# Altium schematic symbol library con-amp.SCHLIB: 238 symbols (part 2 of 3) (continued)
## FTOP-12 (continued)
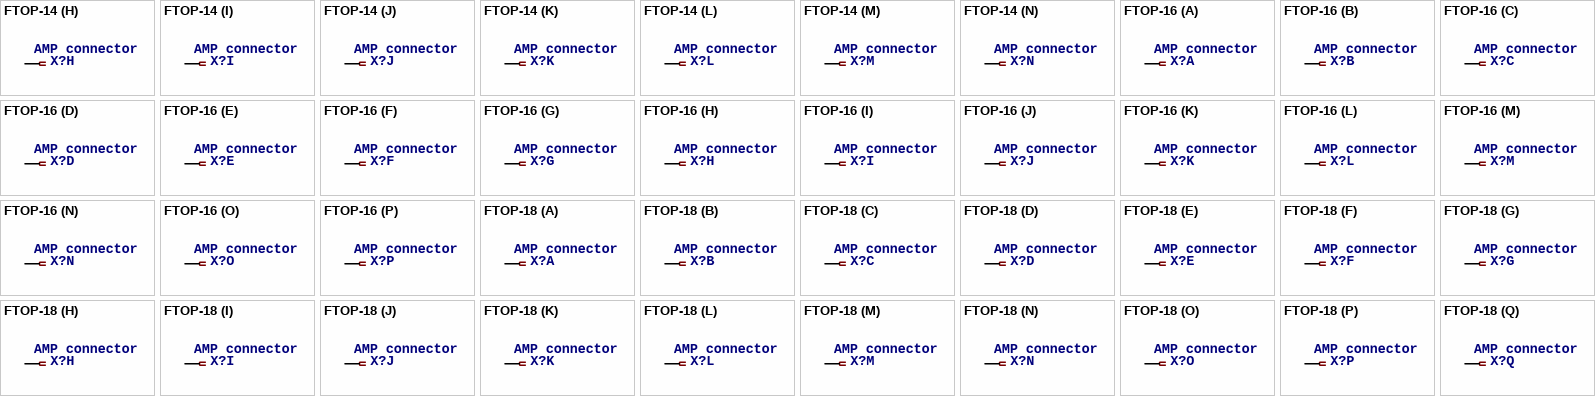
[diagram p16: symbols FTOP-14 to FTOP-18]

## FTOP-14
designator X?, comment AMP connector
footprint FTOP-14
part A pins: 1
part B pins: 2 1
part C pins: 3 1
part D pins: 4 1
part E pins: 5 1
part F pins: 6 1
part G pins: 7 1
part H pins: 8 1
part I pins: 9 1
part J pins: 10 1
part K pins: 11 1
part L pins: 12 1
part M pins: 13 1
part N pins: 14 1

## FTOP-16
designator X?, comment AMP connector
footprint FTOP-16
part A pins: 1
part B pins: 2 1
part C pins: 3 1
part D pins: 4 1
part E pins: 5 1
part F pins: 6 1
part G pins: 7 1
part H pins: 8 1
part I pins: 9 1
part J pins: 10 1
part K pins: 11 1
part L pins: 12 1
part M pins: 13 1
part N pins: 14 1
part O pins: 15 1
part P pins: 16 1

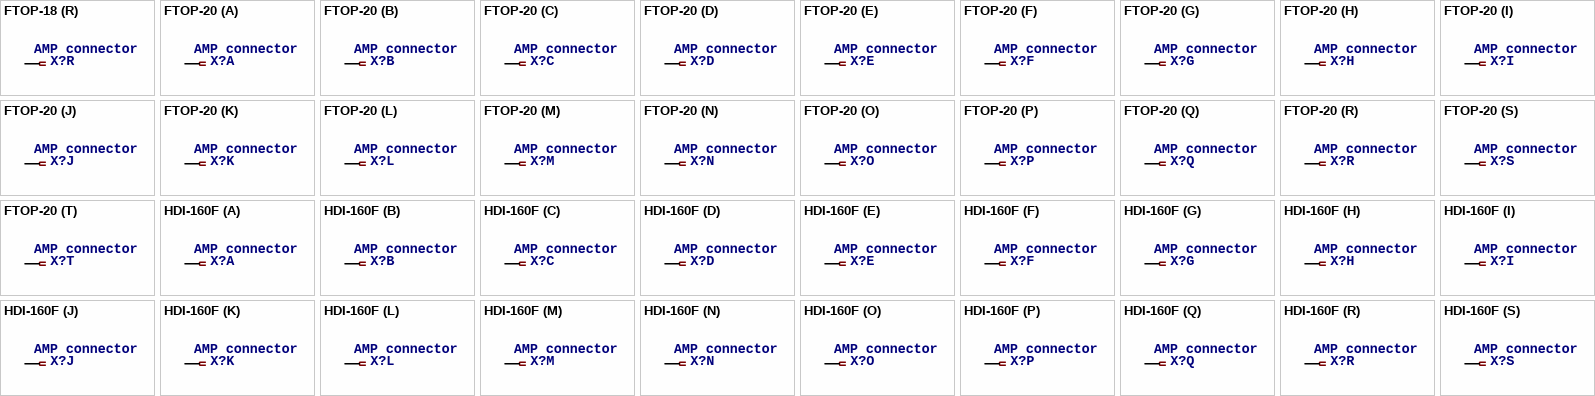
[diagram p17: symbols FTOP-18 to HDI-160F]

## FTOP-18
designator X?, comment AMP connector
footprint FTOP-18
part A pins: 1
part B pins: 2 1
part C pins: 3 1
part D pins: 4 1
part E pins: 5 1
part F pins: 6 1
part G pins: 7 1
part H pins: 8 1
part I pins: 9 1
part J pins: 10 1
part K pins: 11 1
part L pins: 12 1
part M pins: 13 1
part N pins: 14 1
part O pins: 15 1
part P pins: 16 1
part Q pins: 17 1
part R pins: 18 1

## FTOP-20
designator X?, comment AMP connector
footprint FTOP-20
part A pins: 1
part B pins: 2 1
part C pins: 3 1
part D pins: 4 1
part E pins: 5 1
part F pins: 6 1
part G pins: 7 1
part H pins: 8 1
part I pins: 9 1
part J pins: 10 1
part K pins: 11 1
part L pins: 12 1
part M pins: 13 1
part N pins: 14 1
part O pins: 15 1
part P pins: 16 1
part Q pins: 17 1
part R pins: 18 1
part S pins: 19 1
part T pins: 20 1

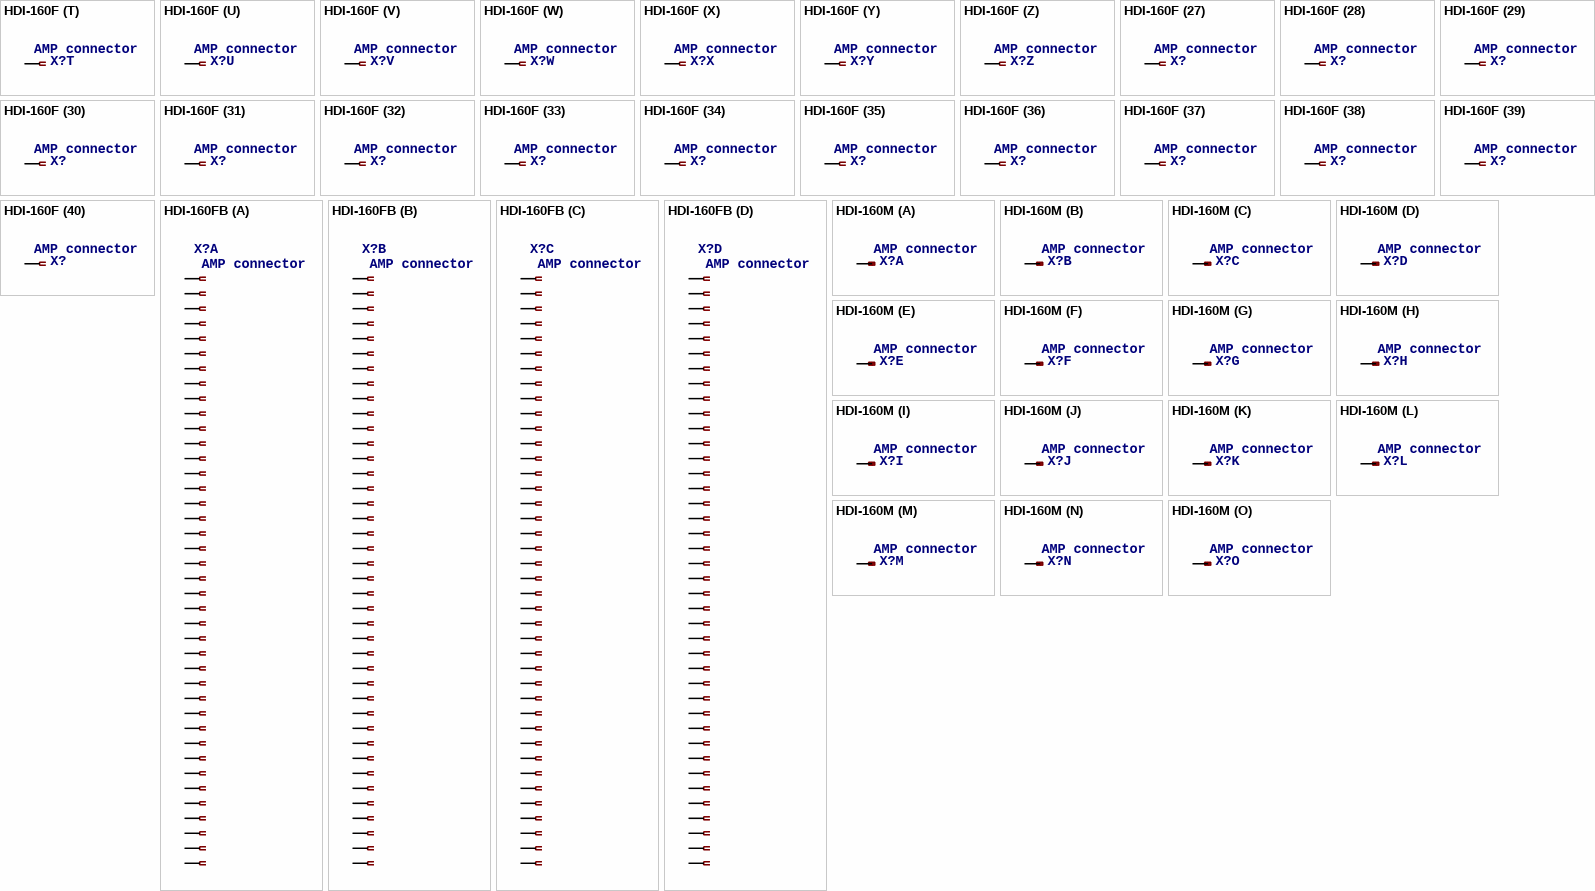
[diagram p18: symbols HDI-160F to HDI-160M]

## HDI-160F
designator X?, comment AMP connector
footprint HDI-160F
part A pins: A1 1
part B pins: A2 1
part C pins: A3 1
part D pins: A4 1
part E pins: A5 1
part F pins: A6 1
part G pins: A7 1
part H pins: A8 1
part I pins: A9 1
part J pins: A10 1
part K pins: A11 1
part L pins: A12 1
part M pins: A13 1
part N pins: A14 1
part O pins: A15 1
part P pins: A16 1
part Q pins: A17 1
part R pins: A18 1
part S pins: A19 1
part T pins: A20 1
part U pins: A21 1
part V pins: A22 1
part W pins: A23 1
part X pins: A24 1
part Y pins: A25 1
part Z pins: A26 1
part 27 pins: A27 1
part 28 pins: A28 1
part 29 pins: A29 1
part 30 pins: A30 1
part 31 pins: A31 1
part 32 pins: A32 1
part 33 pins: A33 1
part 34 pins: A34 1
part 35 pins: A35 1
part 36 pins: A36 1
part 37 pins: A37 1
part 38 pins: A38 1
part 39 pins: A39 1
part 40 pins: A40 1
part 41 pins: B1 1
part 42 pins: B2 1
part 43 pins: B3 1
part 44 pins: B4 1
part 45 pins: B5 1
part 46 pins: B6 1
part 47 pins: B7 1
part 48 pins: B8 1
part 49 pins: B9 1
part 50 pins: B10 1
part 51 pins: B11 1
part 52 pins: B12 1
part 53 pins: B13 1
part 54 pins: B14 1
part 55 pins: B15 1
part 56 pins: B16 1
part 57 pins: B17 1
part 58 pins: B18 1
part 59 pins: B19 1
part 60 pins: B20 1
part 61 pins: B21 1
part 62 pins: B22 1
part 63 pins: B23 1
part 64 pins: B24 1
part 65 pins: B25 1
part 66 pins: B26 1
part 67 pins: B27 1
part 68 pins: B28 1
part 69 pins: B29 1
part 70 pins: B30 1
part 71 pins: B31 1
part 72 pins: B32 1
part 73 pins: B33 1
part 74 pins: B34 1
part 75 pins: B35 1
part 76 pins: B36 1
part 77 pins: B37 1
part 78 pins: B38 1
part 79 pins: B39 1
part 80 pins: B40 1
part 81 pins: C1 1
part 82 pins: C2 1
part 83 pins: C3 1
part 84 pins: C4 1
part 85 pins: C5 1
part 86 pins: C6 1
part 87 pins: C7 1
part 88 pins: C8 1
part 89 pins: C9 1
part 90 pins: C10 1
part 91 pins: C11 1
part 92 pins: C12 1
part 93 pins: C13 1
part 94 pins: C14 1
part 95 pins: C15 1
part 96 pins: C16 1
part 97 pins: C17 1
part 98 pins: C18 1
part 99 pins: C19 1
part 100 pins: C20 1
part 101 pins: C21 1
part 102 pins: C22 1
part 103 pins: C23 1
part 104 pins: C24 1
part 105 pins: C25 1
part 106 pins: C26 1
part 107 pins: C27 1
part 108 pins: C28 1
part 109 pins: C29 1
part 110 pins: C30 1
part 111 pins: C31 1
part 112 pins: C32 1
part 113 pins: C33 1
part 114 pins: C34 1
part 115 pins: C35 1
part 116 pins: C36 1
part 117 pins: C37 1
part 118 pins: C38 1
part 119 pins: C39 1
part 120 pins: C40 1
part 121 pins: D1 1
part 122 pins: D2 1
part 123 pins: D3 1
part 124 pins: D4 1
part 125 pins: D5 1
part 126 pins: D6 1
part 127 pins: D7 1
part 128 pins: D8 1
part 129 pins: D9 1
part 130 pins: D10 1
part 131 pins: D11 1
part 132 pins: D12 1
part 133 pins: D13 1
part 134 pins: D14 1
part 135 pins: D15 1
part 136 pins: D16 1
part 137 pins: D17 1
part 138 pins: D18 1
part 139 pins: D19 1
part 140 pins: D20 1
part 141 pins: D21 1
part 142 pins: D22 1
part 143 pins: D23 1
part 144 pins: D24 1
part 145 pins: D25 1
part 146 pins: D26 1
part 147 pins: D27 1
part 148 pins: D28 1
part 149 pins: D29 1
part 150 pins: D30 1
part 151 pins: D31 1
part 152 pins: D32 1
part 153 pins: D33 1
part 154 pins: D34 1
part 155 pins: D35 1
part 156 pins: D36 1
part 157 pins: D37 1
part 158 pins: D38 1
part 159 pins: D39 1
part 160 pins: D40 1

## HDI-160FB
designator X?, comment AMP connector
footprint HDI-160F
part A pins: A1 1, A2 2, A3 3, A4 4, A5 5, A6 6, A7 7, A8 8, A9 9, A10 10, A11 11, A12 12, A13 13, A14 14, A15 15, A16 16, A17 17, A18 18, A19 19, A20 20, A21 21, A22 22, A23 23, A24 24, A25 25, A26 26, A27 27, A28 28, A29 29, A30 30, A31 31, A32 32, A33 33, A34 34, A35 35, A36 36, A37 37, A38 38, A39 39, A40 40
part B pins: B1 1, B2 2, B3 3, B4 4, B5 5, B6 6, B7 7, B8 8, B9 9, B10 10, B11 11, B12 12, B13 13, B14 14, B15 15, B16 16, B17 17, B18 18, B19 19, B20 20, B21 21, B22 22, B23 23, B24 24, B25 25, B26 26, B27 27, B28 28, B29 29, B30 30, B31 31, B32 32, B33 33, B34 34, B35 35, B36 36, B37 37, B38 38, B39 39, B40 40
part C pins: C1 1, C2 2, C3 3, C4 4, C5 5, C6 6, C7 7, C8 8, C9 9, C10 10, C11 11, C12 12, C13 13, C14 14, C15 15, C16 16, C17 17, C18 18, C19 19, C20 20, C21 21, C22 22, C23 23, C24 24, C25 25, C26 26, C27 27, C28 28, C29 29, C30 30, C31 31, C32 32, C33 33, C34 34, C35 35, C36 36, C37 37, C38 38, C39 39, C40 40
part D pins: D1 1, D2 2, D3 3, D4 4, D5 5, D6 6, D7 7, D8 8, D9 9, D10 10, D11 11, D12 12, D13 13, D14 14, D15 15, D16 16, D17 17, D18 18, D19 19, D20 20, D21 21, D22 22, D23 23, D24 24, D25 25, D26 26, D27 27, D28 28, D29 29, D30 30, D31 31, D32 32, D33 33, D34 34, D35 35, D36 36, D37 37, D38 38, D39 39, D40 40

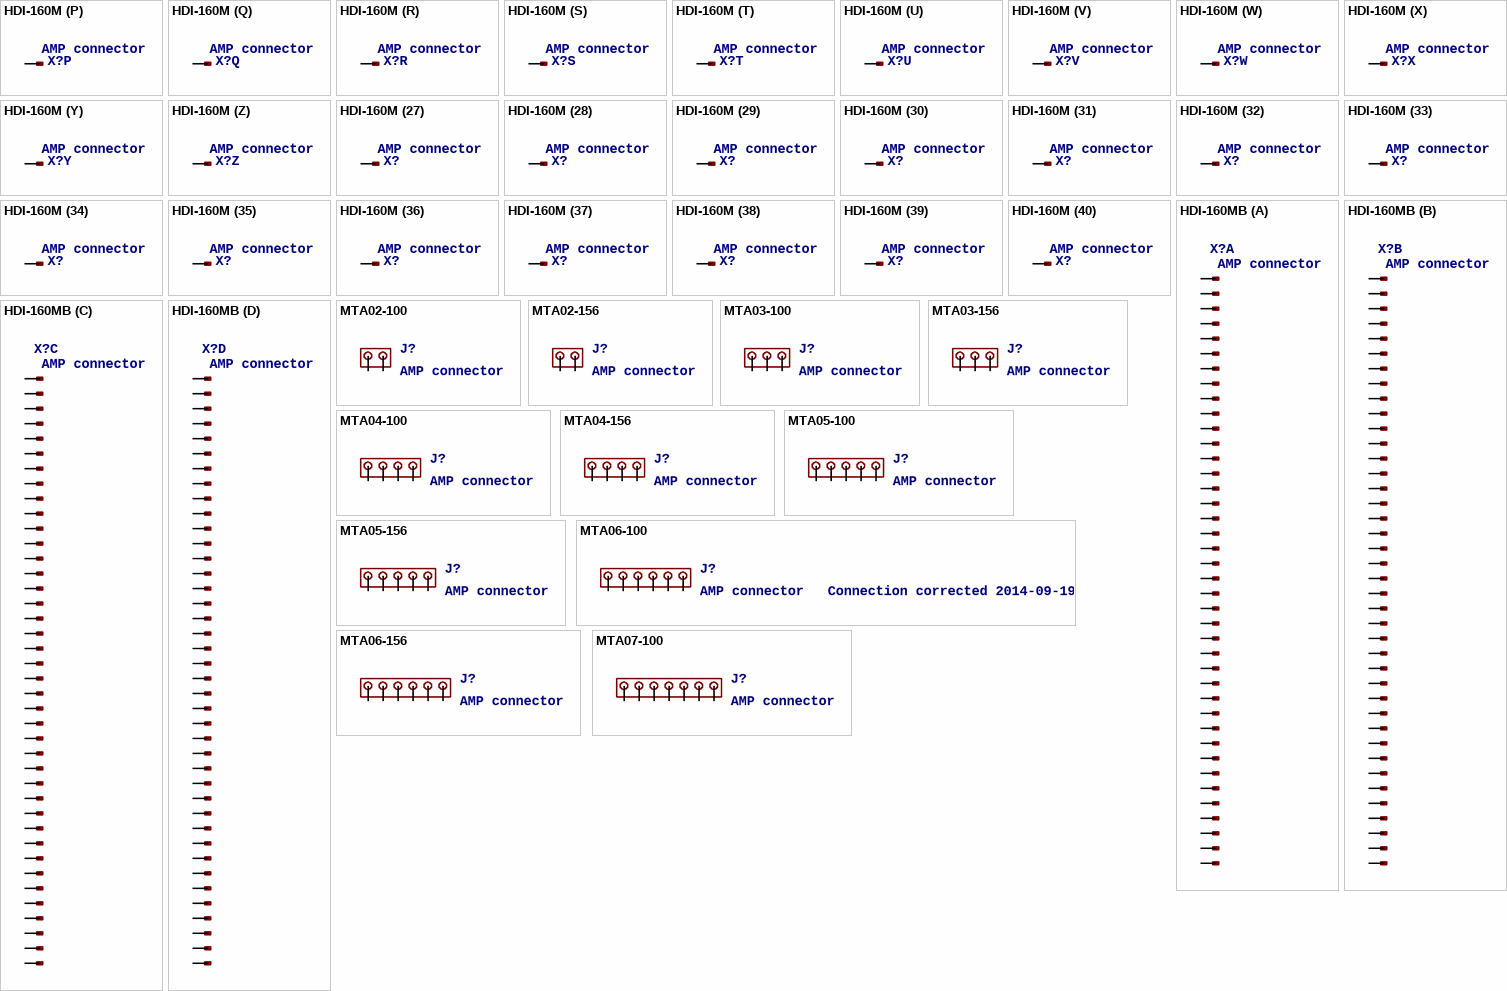
[diagram p19: symbols HDI-160M to MTA07-100]

## HDI-160M
designator X?, comment AMP connector
footprint HDI-160M
part A pins: A1 1
part B pins: A2 1
part C pins: A3 1
part D pins: A4 1
part E pins: A5 1
part F pins: A6 1
part G pins: A7 1
part H pins: A8 1
part I pins: A9 1
part J pins: A10 1
part K pins: A11 1
part L pins: A12 1
part M pins: A13 1
part N pins: A14 1
part O pins: A15 1
part P pins: A16 1
part Q pins: A17 1
part R pins: A18 1
part S pins: A19 1
part T pins: A20 1
part U pins: A21 1
part V pins: A22 1
part W pins: A23 1
part X pins: A24 1
part Y pins: A25 1
part Z pins: A26 1
part 27 pins: A27 1
part 28 pins: A28 1
part 29 pins: A29 1
part 30 pins: A30 1
part 31 pins: A31 1
part 32 pins: A32 1
part 33 pins: A33 1
part 34 pins: A34 1
part 35 pins: A35 1
part 36 pins: A36 1
part 37 pins: A37 1
part 38 pins: A38 1
part 39 pins: A39 1
part 40 pins: A40 1
part 41 pins: B1 1
part 42 pins: B2 1
part 43 pins: B3 1
part 44 pins: B4 1
part 45 pins: B5 1
part 46 pins: B6 1
part 47 pins: B7 1
part 48 pins: B8 1
part 49 pins: B9 1
part 50 pins: B10 1
part 51 pins: B11 1
part 52 pins: B12 1
part 53 pins: B13 1
part 54 pins: B14 1
part 55 pins: B15 1
part 56 pins: B16 1
part 57 pins: B17 1
part 58 pins: B18 1
part 59 pins: B19 1
part 60 pins: B20 1
part 61 pins: B21 1
part 62 pins: B22 1
part 63 pins: B23 1
part 64 pins: B24 1
part 65 pins: B25 1
part 66 pins: B26 1
part 67 pins: B27 1
part 68 pins: B28 1
part 69 pins: B29 1
part 70 pins: B30 1
part 71 pins: B31 1
part 72 pins: B32 1
part 73 pins: B33 1
part 74 pins: B34 1
part 75 pins: B35 1
part 76 pins: B36 1
part 77 pins: B37 1
part 78 pins: B38 1
part 79 pins: B39 1
part 80 pins: B40 1
part 81 pins: C1 1
part 82 pins: C2 1
part 83 pins: C3 1
part 84 pins: C4 1
part 85 pins: C5 1
part 86 pins: C6 1
part 87 pins: C7 1
part 88 pins: C8 1
part 89 pins: C9 1
part 90 pins: C10 1
part 91 pins: C11 1
part 92 pins: C12 1
part 93 pins: C13 1
part 94 pins: C14 1
part 95 pins: C15 1
part 96 pins: C16 1
part 97 pins: C17 1
part 98 pins: C18 1
part 99 pins: C19 1
part 100 pins: C20 1
part 101 pins: C21 1
part 102 pins: C22 1
part 103 pins: C23 1
part 104 pins: C24 1
part 105 pins: C25 1
part 106 pins: C26 1
part 107 pins: C27 1
part 108 pins: C28 1
part 109 pins: C29 1
part 110 pins: C30 1
part 111 pins: C31 1
part 112 pins: C32 1
part 113 pins: C33 1
part 114 pins: C34 1
part 115 pins: C35 1
part 116 pins: C36 1
part 117 pins: C37 1
part 118 pins: C38 1
part 119 pins: C39 1
part 120 pins: C40 1
part 121 pins: D1 1
part 122 pins: D2 1
part 123 pins: D3 1
part 124 pins: D4 1
part 125 pins: D5 1
part 126 pins: D6 1
part 127 pins: D7 1
part 128 pins: D8 1
part 129 pins: D9 1
part 130 pins: D10 1
part 131 pins: D11 1
part 132 pins: D12 1
part 133 pins: D13 1
part 134 pins: D14 1
part 135 pins: D15 1
part 136 pins: D16 1
part 137 pins: D17 1
part 138 pins: D18 1
part 139 pins: D19 1
part 140 pins: D20 1
part 141 pins: D21 1
part 142 pins: D22 1
part 143 pins: D23 1
part 144 pins: D24 1
part 145 pins: D25 1
part 146 pins: D26 1
part 147 pins: D27 1
part 148 pins: D28 1
part 149 pins: D29 1
part 150 pins: D30 1
part 151 pins: D31 1
part 152 pins: D32 1
part 153 pins: D33 1
part 154 pins: D34 1
part 155 pins: D35 1
part 156 pins: D36 1
part 157 pins: D37 1
part 158 pins: D38 1
part 159 pins: D39 1
part 160 pins: D40 1

## HDI-160MB
designator X?, comment AMP connector
footprint HDI-160M
part A pins: A1 1, A2 2, A3 3, A4 4, A5 5, A6 6, A7 7, A8 8, A9 9, A10 10, A11 11, A12 12, A13 13, A14 14, A15 15, A16 16, A17 17, A18 18, A19 19, A20 20, A21 21, A22 22, A23 23, A24 24, A25 25, A26 26, A27 27, A28 28, A29 29, A30 30, A31 31, A32 32, A33 33, A34 34, A35 35, A36 36, A37 37, A38 38, A39 39, A40 40
part B pins: B1 1, B2 2, B3 3, B4 4, B5 5, B6 6, B7 7, B8 8, B9 9, B10 10, B11 11, B12 12, B13 13, B14 14, B15 15, B16 16, B17 17, B18 18, B19 19, B20 20, B21 21, B22 22, B23 23, B24 24, B25 25, B26 26, B27 27, B28 28, B29 29, B30 30, B31 31, B32 32, B33 33, B34 34, B35 35, B36 36, B37 37, B38 38, B39 39, B40 40
part C pins: C1 1, C2 2, C3 3, C4 4, C5 5, C6 6, C7 7, C8 8, C9 9, C10 10, C11 11, C12 12, C13 13, C14 14, C15 15, C16 16, C17 17, C18 18, C19 19, C20 20, C21 21, C22 22, C23 23, C24 24, C25 25, C26 26, C27 27, C28 28, C29 29, C30 30, C31 31, C32 32, C33 33, C34 34, C35 35, C36 36, C37 37, C38 38, C39 39, C40 40
part D pins: D1 1, D2 2, D3 3, D4 4, D5 5, D6 6, D7 7, D8 8, D9 9, D10 10, D11 11, D12 12, D13 13, D14 14, D15 15, D16 16, D17 17, D18 18, D19 19, D20 20, D21 21, D22 22, D23 23, D24 24, D25 25, D26 26, D27 27, D28 28, D29 29, D30 30, D31 31, D32 32, D33 33, D34 34, D35 35, D36 36, D37 37, D38 38, D39 39, D40 40

## MTA02-100
designator J?, comment AMP connector
footprint 10X02MTA
pins: 1, 2

## MTA02-156
designator J?, comment AMP connector
footprint 1X2MTA
pins: 1, 2

## MTA03-100
designator J?, comment AMP connector
footprint 10X03MTA
pins: 1, 2, 3

## MTA03-156
designator J?, comment AMP connector
footprint 1X3MTA
pins: 1, 2, 3

## MTA04-100
designator J?, comment AMP connector
footprint 10X04MTA
pins: 1, 2, 3, 4

## MTA04-156
designator J?, comment AMP connector
footprint 1X4MTA
pins: 1, 2, 3, 4

## MTA05-100
designator J?, comment AMP connector
footprint 10X05MTA
pins: 1, 2, 3, 4, 5

## MTA05-156
designator J?, comment AMP connector
footprint 1X5MTA
pins: 1, 2, 3, 4, 5

## MTA06-100
designator J?, comment AMP connector   Connection corrected 2014-09-19
footprint 10X06MTA
pins: 1, 2, 3, 4, 5, 6

## MTA06-156
designator J?, comment AMP connector
footprint 1X6MTA
pins: 1, 2, 3, 4, 5, 6

## MTA07-100
designator J?, comment AMP connector
footprint 10X07MTA
pins: 1, 2, 3, 4, 5, 6, 7

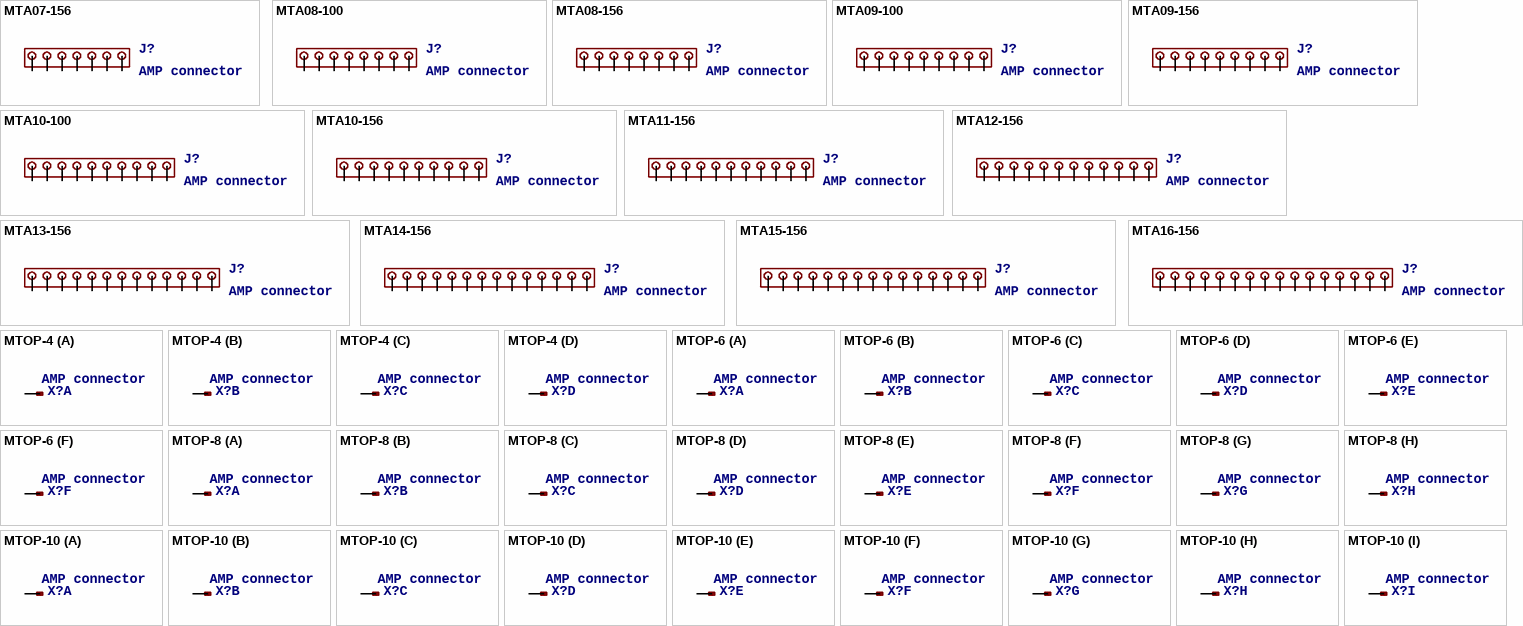
[diagram p20: symbols MTA07-156 to MTOP-10]

## MTA07-156
designator J?, comment AMP connector
footprint 1X7MTA
pins: 1, 2, 3, 4, 5, 6, 7

## MTA08-100
designator J?, comment AMP connector
footprint 10X08MTA
pins: 1, 2, 3, 4, 5, 6, 7, 8

## MTA08-156
designator J?, comment AMP connector
footprint 1X8MTA
pins: 1, 2, 3, 4, 5, 6, 7, 8

## MTA09-100
designator J?, comment AMP connector
footprint 10X09MTA
pins: 1, 2, 3, 4, 5, 6, 7, 8, 9

## MTA09-156
designator J?, comment AMP connector
footprint 1X9MTA
pins: 1, 2, 3, 4, 5, 6, 7, 8, 9

## MTA10-100
designator J?, comment AMP connector
footprint 10X10MTA
pins: 1, 2, 3, 4, 5, 6, 7, 8, 9, 10

## MTA10-156
designator J?, comment AMP connector
footprint 1X10MTA
pins: 1, 2, 3, 4, 5, 6, 7, 8, 9, 10

## MTA11-156
designator J?, comment AMP connector
footprint 1X11MTA
pins: 1, 2, 3, 4, 5, 6, 7, 8, 9, 10, 11

## MTA12-156
designator J?, comment AMP connector
footprint 1X12MTA
pins: 1, 2, 3, 4, 5, 6, 7, 8, 9, 10, 11, 12

## MTA13-156
designator J?, comment AMP connector
footprint 1X13MTA
pins: 1, 2, 3, 4, 5, 6, 7, 8, 9, 10, 11, 12, 13

## MTA14-156
designator J?, comment AMP connector
footprint 1X14MTA
pins: 1, 2, 3, 4, 5, 6, 7, 8, 9, 10, 11, 12, 13, 14

## MTA15-156
designator J?, comment AMP connector
footprint 1X15MTA
pins: 1, 2, 3, 4, 5, 6, 7, 8, 9, 10, 11, 12, 13, 14, 15

## MTA16-156
designator J?, comment AMP connector
footprint 1X16MTA
pins: 1, 2, 3, 4, 5, 6, 7, 8, 9, 10, 11, 12, 13, 14, 15, 16

## MTOP-4
designator X?, comment AMP connector
footprint MTOP-4
part A pins: 1
part B pins: 2 1
part C pins: 3 1
part D pins: 4 1

## MTOP-6
designator X?, comment AMP connector
footprint MTOP-6
part A pins: 1
part B pins: 2 1
part C pins: 3 1
part D pins: 4 1
part E pins: 5 1
part F pins: 6 1

## MTOP-8
designator X?, comment AMP connector
footprint MTOP-8
part A pins: 1
part B pins: 2 1
part C pins: 3 1
part D pins: 4 1
part E pins: 5 1
part F pins: 6 1
part G pins: 7 1
part H pins: 8 1

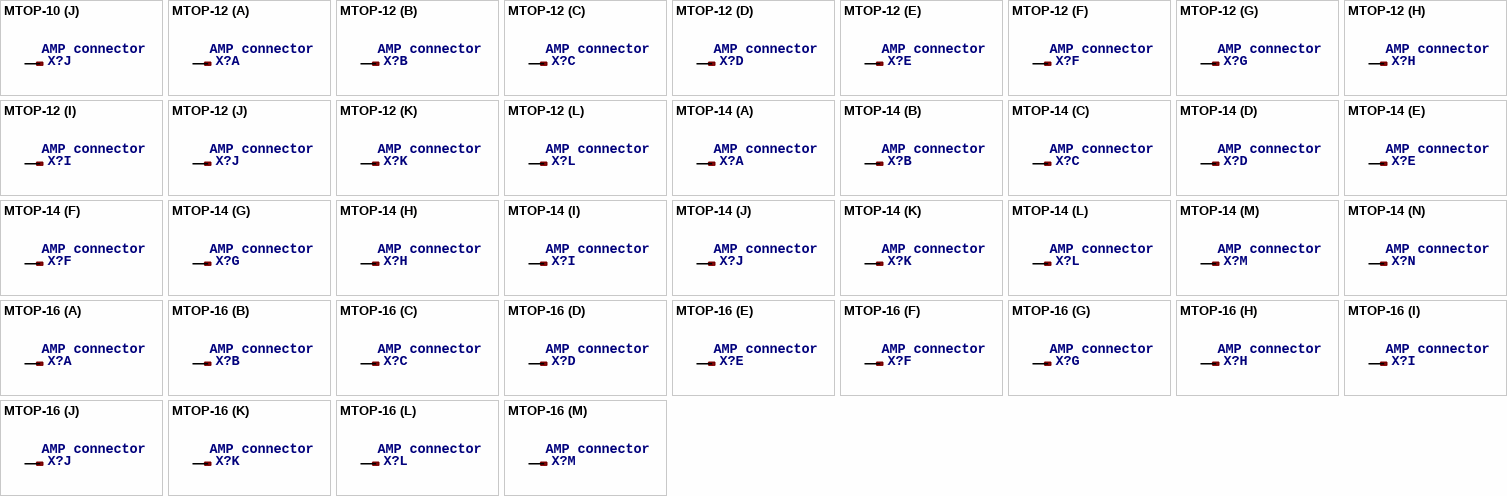
[diagram p21: symbols MTOP-10 to MTOP-16]

## MTOP-10
designator X?, comment AMP connector
footprint MTOP-10
part A pins: 1
part B pins: 2 1
part C pins: 3 1
part D pins: 4 1
part E pins: 5 1
part F pins: 6 1
part G pins: 7 1
part H pins: 8 1
part I pins: 9 1
part J pins: 10 1

## MTOP-12
designator X?, comment AMP connector
footprint MTOP-12
part A pins: 1
part B pins: 2 1
part C pins: 3 1
part D pins: 4 1
part E pins: 5 1
part F pins: 6 1
part G pins: 7 1
part H pins: 8 1
part I pins: 9 1
part J pins: 10 1
part K pins: 11 1
part L pins: 12 1

## MTOP-14
designator X?, comment AMP connector
footprint MTOP-14
part A pins: 1
part B pins: 2 1
part C pins: 3 1
part D pins: 4 1
part E pins: 5 1
part F pins: 6 1
part G pins: 7 1
part H pins: 8 1
part I pins: 9 1
part J pins: 10 1
part K pins: 11 1
part L pins: 12 1
part M pins: 13 1
part N pins: 14 1

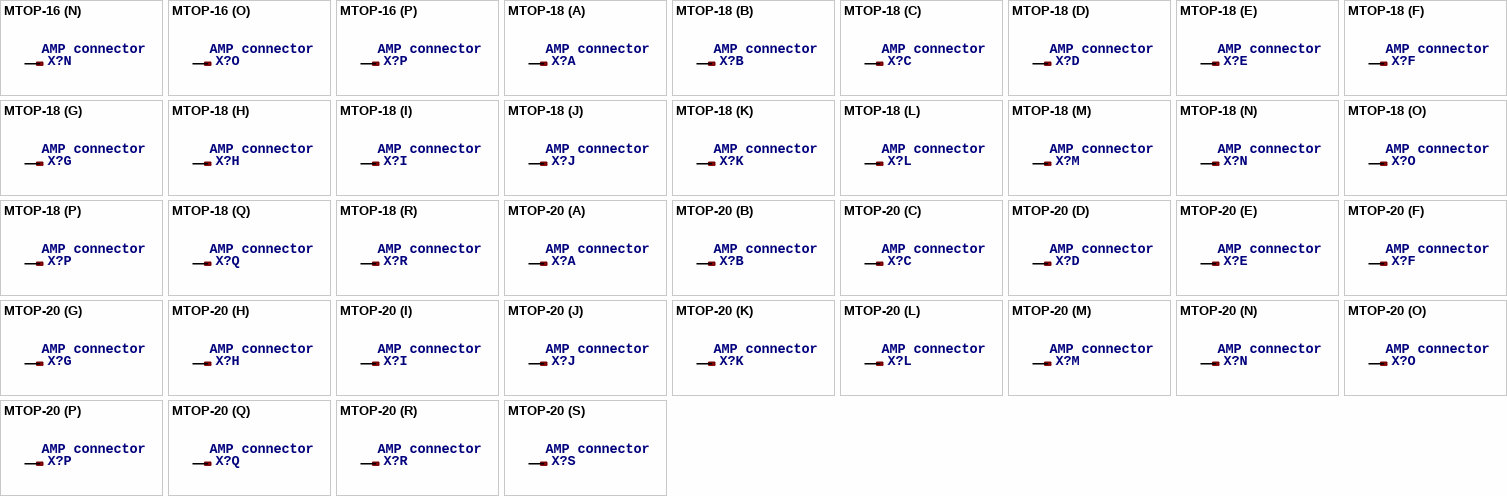
[diagram p22: symbols MTOP-16 to MTOP-20]

## MTOP-16
designator X?, comment AMP connector
footprint MTOP-16
part A pins: 1
part B pins: 2 1
part C pins: 3 1
part D pins: 4 1
part E pins: 5 1
part F pins: 6 1
part G pins: 7 1
part H pins: 8 1
part I pins: 9 1
part J pins: 10 1
part K pins: 11 1
part L pins: 12 1
part M pins: 13 1
part N pins: 14 1
part O pins: 15 1
part P pins: 16 1

## MTOP-18
designator X?, comment AMP connector
footprint MTOP-18
part A pins: 1
part B pins: 2 1
part C pins: 3 1
part D pins: 4 1
part E pins: 5 1
part F pins: 6 1
part G pins: 7 1
part H pins: 8 1
part I pins: 9 1
part J pins: 10 1
part K pins: 11 1
part L pins: 12 1
part M pins: 13 1
part N pins: 14 1
part O pins: 15 1
part P pins: 16 1
part Q pins: 17 1
part R pins: 18 1

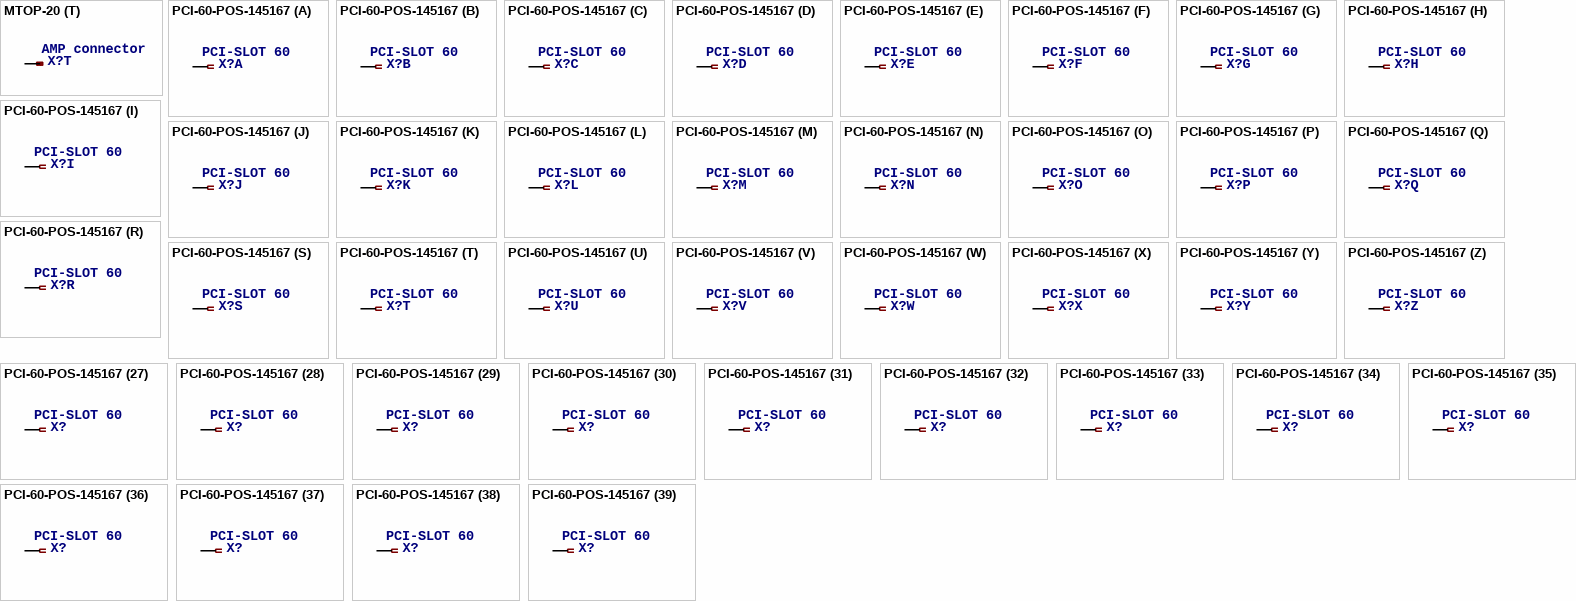
[diagram p23: symbols MTOP-20 to PCI-60-POS-145167]

## MTOP-20
designator X?, comment AMP connector
footprint MTOP-20
part A pins: 1
part B pins: 2 1
part C pins: 3 1
part D pins: 4 1
part E pins: 5 1
part F pins: 6 1
part G pins: 7 1
part H pins: 8 1
part I pins: 9 1
part J pins: 10 1
part K pins: 11 1
part L pins: 12 1
part M pins: 13 1
part N pins: 14 1
part O pins: 15 1
part P pins: 16 1
part Q pins: 17 1
part R pins: 18 1
part S pins: 19 1
part T pins: 20 1
